# Altium integrated library EFR_Lib.IntLib: 430 symbols (part 3 of 6)
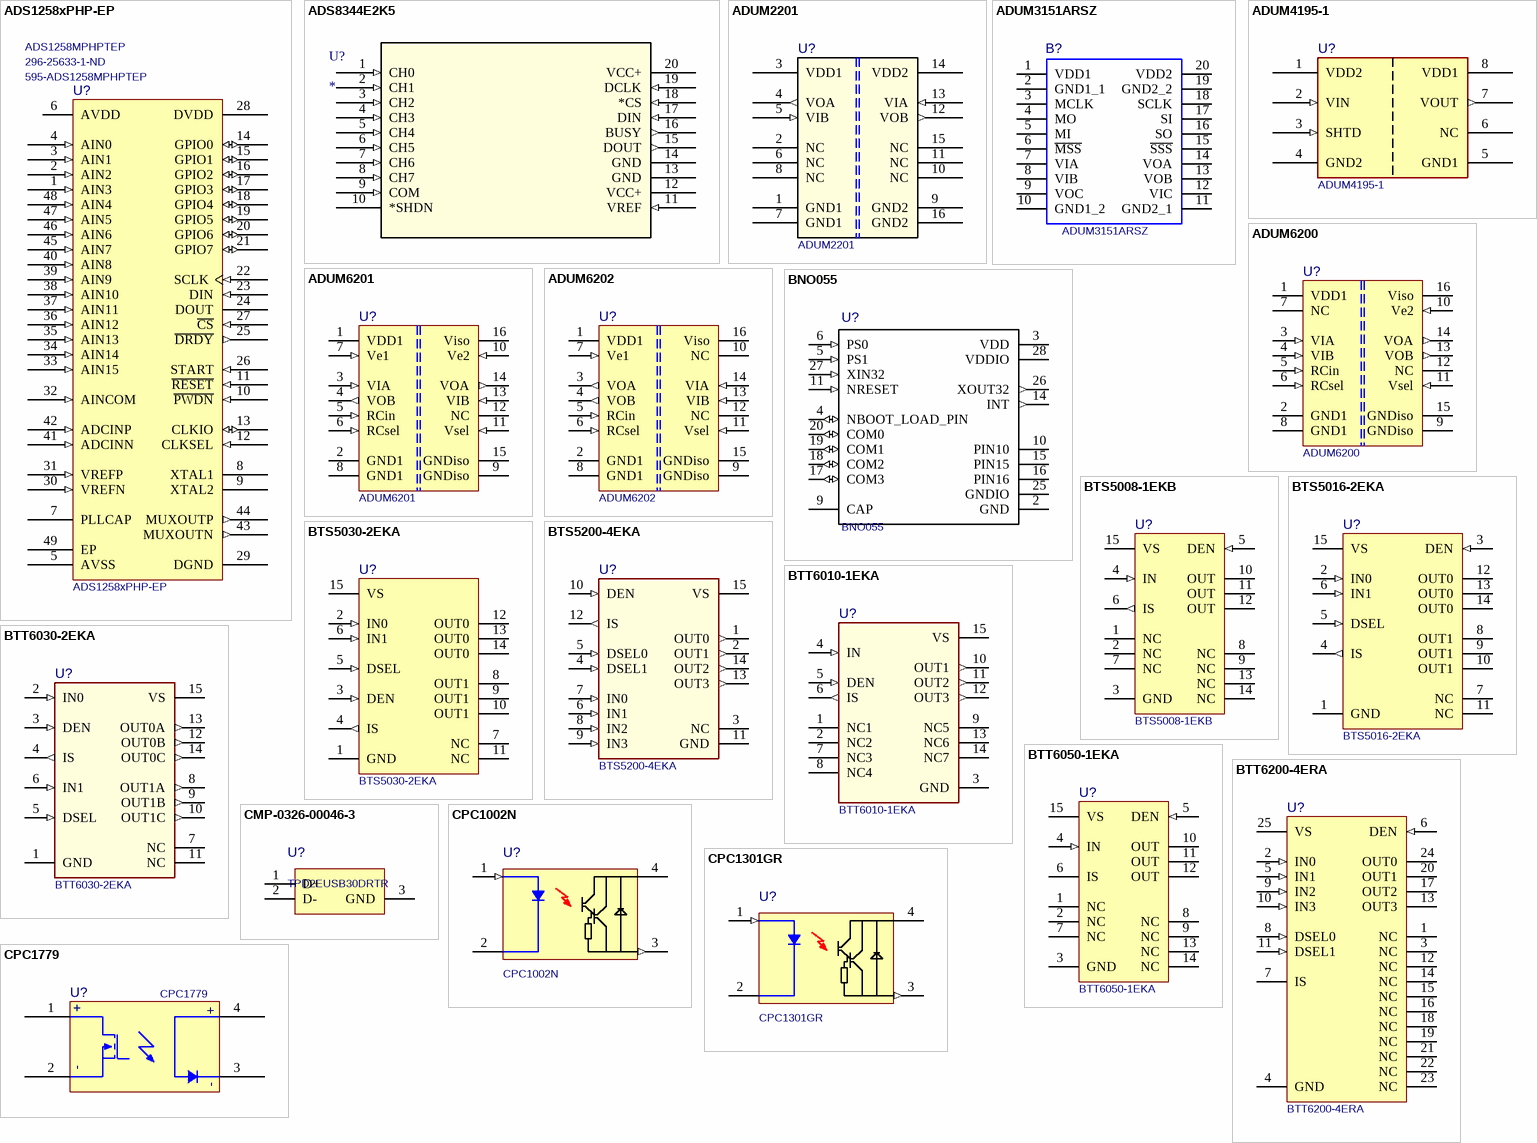
[diagram p31: symbols ADS1258xPHP-EP to CPC1779]

## ADUM6201
designator U?
Dual-Channel, 5 kV Isolators with Integrated DC-to-DC Converter; Manufacturer: Analog Devices; Pin Number: 16; ComponentLink1Description: Datasheet (Online); ComponentLink1URL: https://www.analog.com/media/en/technical-documentation/data-sheets/ADuM6200_6201_6202.pdf; ComponentLink2Description: Datasheet (Local); ComponentLink2URL: ..\Datasheet\Analog_Devices\ADuM6200_6201_6202.pdf; ComponentLink3Description: Datasheet (SVN); ComponentLink3URL: https://teamsvn.elbflorace.de/00_Bibliothek/Libraries/Altium/AltiumLibs/Datasheet/ADuM6200_6201_6202.pdf; ComponentLink4Description: Manufacturer-Site; ComponentLink4URL: https://www.analog.com/en/products/adum6201.html; Manufacturer P/N: ADuM6201; Mounting Technology: SMT
footprint SOIC_IC_16 (RI-16-1) (SOIC, 16-Leads, Body 12,80x7,50mm, Pitch 1,27mm, IPC Low Density)
footprint SOIC_W_16 (RW-16) (SOIC, 16-Leads, Body 10,5x7,6mm (max), Pitch 1,27mm, IPC Medium Density)
pins: 1 VDD1 "Primary Supply Voltage, 3.0 V to 5.5 V.", 2 GND1 "Ground Reference for the Primary Side of the Isolator. Pin 2 and Pin 8 are internally connected to each other, and it is recommended that both pins be connected to a common ground.", 3 VIA (in) "Logic Input A", 4 VOB (out) "Logic Output B", 5 RCin (in) "Regulation Control Input. This pin must be connected to the RCOUT pin of a master isoPower device or tied low. This pin must not be tied high if RCSEL is low; this combination causes excessive voltage on the secondary side of the isolator, damaging the ADuM6201 and possibly the devices that it powers.", 6 RCsel (in) "Control Input. Determines self-regulation mode (RCSEL high) or slave mode (RCSEL low), allowing external regulation. This pin is weakly pulled to the high state. In noisy environments, tie this pin either high or low.", 7 Ve1 (in) "Data Enable Input. When this pin is high or not connected, the primary output is active; when this pin is low, the output is in a high-Z state.", 8 GND1 "Ground Reference for the Primary Side of the Isolator. Pin 2 and Pin 8 are internally connected to each other, and it is recommended that both pins be connected to a common ground.", 9 GNDiso "Internally connected to Pin 15, connect to isolated ground", 10 Ve2 (in) "Data Enable Input. When this pin is high or not connected, the secondary output is active; when this pin is low, the output is in a high-Z state.", 11 Vsel (in) "Output Voltage Selection. When VSEL = VISO, the VISO setpoint is 5.0 V. When VSEL = GNDISO, the VISO setpoint is 3.3 V.  In slave regulation mode, this pin has no function.", 12 NC "No Internal Connection.", 13 VIB (in) "Logic Input B", 14 VOA (out) "Logic Output A", 15 GNDiso "Ground Reference for the Secondary Side of the Isolator. Pin 9 and Pin 15 are internally connected to each other, and it is recommended that both pins be connected to a common ground.", 16 Viso "Secondary Supply Voltage. Output for secondary side isolated data channels and external loads."

## ADUM6202
designator U?
Dual-Channel, 5 kV Isolators with Integrated DC-to-DC Converter; Manufacturer: Analog Devices; Pin Number: 16; ComponentLink1Description: Datasheet (Online); ComponentLink1URL: https://www.analog.com/media/en/technical-documentation/data-sheets/ADuM6200_6201_6202.pdf; ComponentLink2Description: Datasheet (Local); ComponentLink2URL: ..\Datasheet\Analog_Devices\ADuM6200_6201_6202.pdf; ComponentLink3Description: Datasheet (SVN); ComponentLink3URL: https://teamsvn.elbflorace.de/00_Bibliothek/Libraries/Altium/AltiumLibs/Datasheet/Analog_Devices/ADuM6200_6201_6202.pdf; ComponentLink4Description: Manufacturer-Site; ComponentLink4URL: https://www.analog.com/en/products/adum6202.html; Manufacturer P/N: ADuM6202; Mounting Technology: SMT
footprint SOIC_IC_16 (RI-16-1) (SOIC, 16-Leads, Body 12,80x7,50mm, Pitch 1,27mm, IPC Low Density)
footprint SOIC_W_16 (RW-16) (SOIC, 16-Leads, Body 10,5x7,6mm (max), Pitch 1,27mm, IPC Medium Density)
pins: 1 VDD1 "Primary Supply Voltage, 3.0 V to 5.5 V.", 2 GND1 "Ground Reference for the Primary Side of the Isolator. Pin 2 and Pin 8 are internally connected to each other, and it is recommended that both pins be connected to a common ground.", 3 VOA (out) "Logic Output A", 4 VOB (out) "Logic Output B", 5 RCin (in) "Regulation Control Input. This pin must be connected to the RCOUT pin of a master isoPower device or tied low. This pin must not be tied high if RCSEL is low; this combination causes excessive voltage on the secondary sideof the isolator, damaging the ADuM6202 and possibly the devices that it powers.", 6 RCsel (in) "Control Input. Determines self-regulation mode (RCSEL high) or slave mode (RCSEL low), allowing external regulation. This pin is weakly pulled to the high state. In noisy environments, tie this pin either high or low.", 7 Ve1 (in) "Data Enable Input. When this pin is high or not connected, the primary output is active; when this pin is low, the output is in a high-Z state.", 8 GND1 "Ground Reference for the Primary Side of the Isolator. Pin 2 and Pin 8 are internally connected to each other, and it is recommended that both pins be connected to a common ground.", 9 GNDiso "Internally connected to Pin 15, connect to isolated ground", 10 NC "No Internal Connection.", 11 Vsel (in) "Output Voltage Selection. When VSEL = VISO, the VISO setpoint is 5.0 V. When VSEL = GNDISO, the VISO setpoint is 3.3 V.  In slave regulation mode, this pin has no function.", 12 NC "No Internal Connection.", 13 VIB (in) "Logic Input B", 14 VIA (in) "Logic Input A", 15 GNDiso "Ground Reference for the Secondary Side of the Isolator. Pin 9 and Pin 15 are internally connected to each other, and it is recommended that both pins be connected to a common ground.", 16 Viso "Secondary Supply Voltage. Output for secondary side isolated data channels and external loads."

## BNO055
designator U?
Accelerometer, Gyroscope, Magnetometer, 9 Axis Sensor IÂ²C, UART Output; Manufacturer: Bosch; Manufacturer P/N: BNO055; Package: LGA-28 Bosch; ComponentLink1Description: Hersteller; ComponentLink1URL: https://www.mouser.de/ProductDetail/Bosch-Sensortec/BNO055?qs=QhAb4EtQfbV8Z2YmISucWw==; ComponentLink2Description: Datenblatt; ComponentLink2URL: https://www.mouser.de/datasheet/2/783/BST-BNO055-DS000-1509603.pdf; ComponentLink3Description: SnapEDA; ComponentLink3URL: https://www.snapeda.com/parts/BNO055/Bosch%20Sensortec/view-part/51961/?ref=snap; Mounting Technology: SMT
footprint LGA28R50P4X10_380X520X100
pins: 2 GND (power), 3 VDD (power), 4 NBOOT_LOAD_PIN (io), 5 PS1 (in), 6 PS0 (in), 9 CAP, 10 PIN10 (power), 11 NRESET (in), 14 INT (out), 15 PIN15 (power), 16 PIN16 (power), 17 COM3 (io), 18 COM2 (io), 19 COM1 (io), 20 COM0 (io), 25 GNDIO (power), 26 XOUT32 (out), 27 XIN32 (in), 28 VDDIO (power)

## BTS5008-1EKB
designator U?
Smart Highside Power Switch Single Channnel, 8 mOhm, -40 to 150 degC, PG-DSO-14-47, Reel, Green; Manufacturer: Infineon; Green: TRUE; Packing: Reel; PackageDescription: 14-Pin Plastic (Green) Dual Small Outline Package, 8.65 x 3.9 mm Body, 1.27 mm Pitch; PackageReference: PG-DSO-14-47 EP; DatasheetVersion: Rev. 2.0; ComponentLink2Description: Datasheet; ComponentLink1URL: http://www.infineon.com/; Code_JEDEC: MS-012; Mounting Technology: SMT; RevisionNote: Lost Devices pt2; ComponentLink3URL: http://www.infineon.com/dgdl/BTS5008-1EKB-Data-Sheet-20-Infineon.pdf?folderId=db3a304314dca3890114df197b25000f&fileId=db3a30433daca496013db00d97ac1594&sId=db3a30433f2e70c5013f420039644e8f; ComponentLink1Description: Manufacturer URL; ComponentLink3Description: Package Specification; Manufacturer P/N: BTS5008-1EKB; Halogen-free: TRUE; ComponentLink2URL: http://www.infineon.com/dgdl/BTS5008-1EKB-Data-Sheet-20-Infineon.pdf?folderId=db3a304314dca3890114df197b25000f&fileId=db3a30433daca496013db00d97ac1594; PackageVersion: Apr-12
footprint INF-PG-DSO-14-47 EP_M (SOP, 14-Leads, Body 8.65x3.9mm, Pitch 1.27mm, Thermal Pad 6.5x2.75mm, IPC Low Density)
footprint INF-PG-DSO-14-47 EP_N (SOP, 14-Leads, Body 8.65x3.9mm, Pitch 1.27mm, Thermal Pad 6.5x2.75mm, IPC Medium Density)
footprint INF-PG-DSO-14-47 EP_L (SOP, 14-Leads, Body 8.65x3.9mm, Pitch 1.27mm, Thermal Pad 6.5x2.75mm, IPC High Density)
pins: 1 NC "Not Connected; No internal connection to the chip", 2 NC "Not Connected; No internal connection to the chip", 3 GND (power) "GrouND; Ground connection", 4 IN (in) "INput channel; Input signal for channel activation", 5 DEN (in) "Diagnostic ENable; Digital signal to enable/disable the diagnosis of the device", 6 IS (out) "Sense; Sense current of the selected channel", 7 NC "Not Connected; No internal connection to the chip", 8 NC "Not Connected; No internal connection to the chip", 9 NC "Not Connected; No internal connection to the chip", 10 OUT (power) "OUTput; Protected high side power output channel", 11 OUT (power) "OUTput; Protected high side power output channel", 12 OUT (power) "OUTput; Protected high side power output channel", 13 NC "Not Connected; No internal connection to the chip", 14 NC "Not Connected; No internal connection to the chip", 15 VS (power) "Voltage Supply; Battery voltage"

## BTS5016-2EKA
designator U?
Smart High-Side Power Switch, 5 V to 28 V, -40 to 150 degC, PG-DSO-14, Reel, Green; Manufacturer: Infineon; Load Current (typ): 8 A; ton (max): 200 us; Recommended Operating Voltage Min.: 5 V; Diagnostic: Sense; Ptot (max): 2 W; RON (max) @ Tj: 150degreesC=32 mOhm; RON @ Tj: 25degreesC=16 mOhm; Channels: 2; Green: TRUE; Recommended Operating Voltage Max.: 28 V; ComponentLink1URL: http://www.infineon.com/; ComponentLink2URL: https://www.infineon.com/dgdl/Infineon-BTS5016-2EKA-DS-v01_00-EN.pdf?fileId=5546d4625a888733015aa41a5e161129; ComponentLink3URL: http://www.infineon.com/dgdl/BTS5030-2EKA_Data-Sheet_21.pdf?folderId=db3a30431400ef68011421b54e2e0564&fileId=db3a30432a14dd54012a3c882d7f5994&sId=db3a30433d68e984013d83e34cd77b82; DatasheetVersion: Rev. 1.0; Halogen-free: TRUE; Mounting Technology: SMT; Manufacturer P/N: BTS5016-2EKA; Packing: Reel; Code_JEDEC: MS-012; PackageVersion: Sep-11; PackageReference: PG-DSO-14-40; Mounting: SMT; ComponentLink3Description: Package Specification; toff (max): 200 us; PackageDescription: 14-Pin Plastic (Green) Dual Small Outline Package, 8.65 x 3.9 mm Body, 1.27 mm Pitch; ComponentLink2Description: Datasheet; ComponentLink1Description: Manufacturer URL
footprint INF-PG-DSO-14-40_L (SOP, 14-Leads, Body 8.65x3.9mm, Pitch 1.27mm, Thermal Pad 6.5x2.75mm, IPC High Density)
footprint INF-PG-DSO-14-40_M (SOP, 14-Leads, Body 8.65x3.9mm, Pitch 1.27mm, Thermal Pad 6.5x2.6mm, IPC Low Density)
footprint INF-PG-DSO-14-40_N (SOP, 14-Leads, Body 8.65x3.9mm, Pitch 1.27mm, Thermal Pad 6.5x2.75mm, IPC Medium Density)
pins: 1 GND (power) "GrouND; Ground connection", 2 IN0 (in) "INput channel 0; Input signal for channel 0 activation", 3 DEN (in) "Diagnostic ENable; Digital signal to enable/disable the diagnosis of the device", 4 IS (out) "Sense; Sense current of the selected channel", 5 DSEL (in) "Diagnostic SELection; Digital signal to select the channel to be diagnosed", 6 IN1 (in) "INput channel 1; Input signal for channel 1 activation", 7 NC "Not Connected; No internal connection to the chip", 8 OUT1 (power) "OUTput 1; Protected high side power output channel 1", 9 OUT1 (power) "OUTput 1; Protected high side power output channel 1", 10 OUT1 (power) "OUTput 1; Protected high side power output channel 1", 11 NC "Not Connected; No internal connection to the chip", 12 OUT0 (power) "OUTput 0; Protected high side power output channel 0", 13 OUT0 (power) "OUTput 0; Protected high side power output channel 0", 14 OUT0 (power) "OUTput 0; Protected high side power output channel 0", 15 VS (power) "Voltage Supply; Battery voltage"

## BTS5030-2EKA
designator U?
Smart High-Side Power Switch, 5 V to 28 V, -40 to 150 degC, PG-DSO-14, Reel, Green; Manufacturer: Infineon; Load Current (typ): 4 A; ton (max): 200 us; Recommended Operating Voltage Min.: 5 V; Diagnostic: Sense; Ptot (max): 2 W; RON (max) @ Tj: 150degreesC=32 mOhm; RON @ Tj: 25degreesC=16 mOhm; Channels: 2; Green: TRUE; Recommended Operating Voltage Max.: 28 V; ComponentLink1URL: http://www.infineon.com/; ComponentLink2URL: https://www.infineon.com/dgdl/Infineon-BTS5030-2EKA-DS-v02_01-EN.pdf?fileId=5546d4625a888733015aa41a4f9f1125; ComponentLink3URL: http://www.infineon.com/dgdl/BTS5030-2EKA_Data-Sheet_21.pdf?folderId=db3a30431400ef68011421b54e2e0564&fileId=db3a30432a14dd54012a3c882d7f5994&sId=db3a30433d68e984013d83e34cd77b82; DatasheetVersion: Rev. 1.0; Halogen-free: TRUE; Mounting Technology: SMT; Manufacturer P/N: BTS5030-2EKA; Packing: Reel; Code_JEDEC: MS-012; PackageVersion: Sep-11; PackageReference: PG-DSO-14-40; Mounting: SMT; ComponentLink3Description: Package Specification; toff (max): 200 us; PackageDescription: 14-Pin Plastic (Green) Dual Small Outline Package, 8.65 x 3.9 mm Body, 1.27 mm Pitch; ComponentLink2Description: Datasheet; ComponentLink1Description: Manufacturer URL
footprint INF-PG-DSO-14-40_L (SOP, 14-Leads, Body 8.65x3.9mm, Pitch 1.27mm, Thermal Pad 6.5x2.75mm, IPC High Density)
footprint INF-PG-DSO-14-40_M (SOP, 14-Leads, Body 8.65x3.9mm, Pitch 1.27mm, Thermal Pad 6.5x2.6mm, IPC Low Density)
footprint INF-PG-DSO-14-40_N (SOP, 14-Leads, Body 8.65x3.9mm, Pitch 1.27mm, Thermal Pad 6.5x2.75mm, IPC Medium Density)
pins: 1 GND (power) "GrouND; Ground connection", 2 IN0 (in) "INput channel 0; Input signal for channel 0 activation", 3 DEN (in) "Diagnostic ENable; Digital signal to enable/disable the diagnosis of the device", 4 IS (out) "Sense; Sense current of the selected channel", 5 DSEL (in) "Diagnostic SELection; Digital signal to select the channel to be diagnosed", 6 IN1 (in) "INput channel 1; Input signal for channel 1 activation", 7 NC "Not Connected; No internal connection to the chip", 8 OUT1 (power) "OUTput 1; Protected high side power output channel 1", 9 OUT1 (power) "OUTput 1; Protected high side power output channel 1", 10 OUT1 (power) "OUTput 1; Protected high side power output channel 1", 11 NC "Not Connected; No internal connection to the chip", 12 OUT0 (power) "OUTput 0; Protected high side power output channel 0", 13 OUT0 (power) "OUTput 0; Protected high side power output channel 0", 14 OUT0 (power) "OUTput 0; Protected high side power output channel 0", 15 VS (power) "Voltage Supply; Battery voltage"

## BTS5200-4EKA
designator U?
Smart High-Side Power Switch, Quad Channel, 32 mOhm; Manufacturer: Infineon Technologies; Manufacturer P/N: BTS5200-4EKA; PackageReference: PG-DSO-14-48-EP; ComponentLink1Description: Datasheet; ComponentLink1URL: https://www.infineon.com/dgdl/Infineon-BTS5200-4EKA-DS-v01_00-EN.pdf?fileId=5546d4625a888733015aa3fee7cd1052; ComponentLink2Description: Manufacturer; ComponentLink2URL: https://www.infineon.com/cms/en/product/power/smart-low-side-high-side-switches/automotive-smart-high-side-switch-profet/profet-12v/bts5200-4eka/#!packaging; Mounting Technology: SMT
footprint INF-PG-DSO-14-48 (Footprint not found)
pins: 1 OUT0 (out) "OUTput 0; Protected high side power output channel 0.", 2 OUT1 (out) "Output 1; Protected high side power output channel 1.", 3 NC "Not Connected; No internal connection to the chip.", 4 DSEL1 (in) "Diagnostic Selection; Digital signal to select the channel to be diagnosed.", 5 DSEL0 (in) "Diagnostic Selection; Digital signal to select the channel to be diagnosed.", 6 IN1 (in) "Input channel 1; Input signal for channel 1 activation.", 7 IN0 (in) "Input channel 0; Input signal for channel 0 activation.", 8 IN2 (in) "Input channel 2; Input signal for channel 2 activation.", 9 IN3 (in) "Input channel 3; Input signal for channel 3 activation.", 10 DEN (in) "Diagnostic Enable; Digital signal to enable/disable the diagnosis of the device.", 11 GND (power) "Ground", 12 IS (out) "Sense; Sense current of the selected channel.", 13 OUT3 (out) "Output 3; Protected high side power output channel 3.", 14 OUT2 (out) "Output 2; Protected high side power output channel 2.", 15 VS (power) "Voltage Supply; Battery voltage"

## BTT6010-1EKA
designator U?
Smart High-Side Power Switch, Single Channel, 10 mOhm, PROFET +24V; Manufacturer: Infineon Technologies; ComponentLink1Description: Datasheet; ComponentLink1URL: https://www.infineon.com/dgdl/Infineon-BTT6010-1EKA-DataSheet-v01_01-EN.pdf?fileId=5546d4626da6c043016dc935cfed39a3; ComponentLink2Description: Manufacturer; ComponentLink2URL: https://www.infineon.com/cms/en/product/power/smart-low-side-high-side-switches/automotive-smart-high-side-switch-profet/profet-24v/btt6010-1eka/; Type: High-Side-Mosfet; Manufacturer P/N: BTT6010-1EKA; Package: PG-DSO-14-47 EP; Mounting Technology: SMT
footprint INF-PG-DSO-14-47 EP_L (SOP, 14-Leads, Body 8.65x3.9mm, Pitch 1.27mm, Thermal Pad 6.5x2.75mm, IPC High Density)
footprint INF-PG-DSO-14-47 EP_N (SOP, 14-Leads, Body 8.65x3.9mm, Pitch 1.27mm, Thermal Pad 6.5x2.75mm, IPC Medium Density)
footprint INF-PG-DSO-14-47 EP_M (SOP, 14-Leads, Body 8.65x3.9mm, Pitch 1.27mm, Thermal Pad 6.5x2.75mm, IPC Low Density)
pins: 1 NC1 "Not Connected", 2 NC2 "Not Connected", 3 GND (power) "Ground", 4 IN (in) "Input channel", 5 DEN (in) "Diagnostic Enable", 6 IS (out) "Sense", 7 NC3 "Not Connected", 8 NC4 "Not Connected", 9 NC5 "Not Connected", 10 OUT1 (out) "Output", 11 OUT2 (out) "Output", 12 OUT3 (out) "Output", 13 NC6 "Not Connected", 14 NC7 "Not Connected", 15 VS (power) "Voltage Supply"

## BTT6030-2EKA
designator U?
Smart High-Side Power Switch, Dual Channel, 32 mOhm; Manufacturer: Infineon Technologies; Manufacturer P/N: BTT6030-2EKA; PackageReference: PG-DSO-14-40 EP; ComponentLink1Description: Datasheet; ComponentLink1URL: https://www.infineon.com/dgdl/Infineon-BTT6030-2EKA-DataSheet-v01_01-EN.pdf?fileId=5546d4626da6c043016dc9516a1f39b6; ComponentLink2Description: Manufacturer; ComponentLink2URL: https://www.infineon.com/cms/en/product/power/smart-low-side-high-side-switches/automotive-smart-high-side-switch-profet/profet-24v/btt6030-2eka/; Mounting Technology: SMT
footprint INF-PG-DSO-14-40_L (SOP, 14-Leads, Body 8.65x3.9mm, Pitch 1.27mm, Thermal Pad 6.5x2.75mm, IPC High Density)
footprint INF-PG-DSO-14-40_N (SOP, 14-Leads, Body 8.65x3.9mm, Pitch 1.27mm, Thermal Pad 6.5x2.75mm, IPC Medium Density)
footprint INF-PG-DSO-14-40_M (SOP, 14-Leads, Body 8.65x3.9mm, Pitch 1.27mm, Thermal Pad 6.5x2.6mm, IPC Low Density)
pins: 1 GND (power) "Ground", 2 IN0 (in) "Input channel 0; Input signal for channel 0 activation.", 3 DEN (in) "Diagnostic Enable; Digital signal to enable/disable the diagnosis of the device.", 4 IS (out) "Sense; Sense current of the selected channel.", 5 DSEL (in) "Diagnostic Selection; Digital signal to select the channel to be diagnosed.", 6 IN1 (in) "Input channel 1; Input signal for channel 1 activation.", 7 NC "Not Connected; No internal connection to the chip.", 8 OUT1A (out) "Output 1; Protected high side power output channel 1.", 9 OUT1B (out) "Output 1; Protected high side power output channel 1.", 10 OUT1C (out) "Output 1; Protected high side power output channel 1.", 11 NC "Not Connected; No internal connection to the chip.", 12 OUT0B (out) "OUTput 0; Protected high side power output channel 0.", 13 OUT0A (out) "OUTput 0; Protected high side power output channel 0.", 14 OUT0C (out) "OUTput 0; Protected high side power output channel 0.", 15 VS (power) "Voltage Supply; Battery voltage"

## BTT6050-1EKA
designator U?
Smart High-Side Power Switch, 5 to 36 V, -40 to 150 degC, PG-DSO-14, Reel, Green; Manufacturer: Infineon; toff (max): 150 us; Ptot (max): 1.6 W; IL (nom)min - all channels active: 4.5 A; Channels: 1; IL(SC): 38 A; Recommended Operating Voltage Max.: 36 V; Green: TRUE; Diagnostic: Sense; Recommended Operating Voltage Min.: 5 V; ComponentLink2URL: https://datasheet.ciiva.com/29899/infineon-btt6050-1eka-ds-v01-00-en-29899189.pdf?src-supplier=Avnet; ton (max): 150 us; PackageDescription: 14-Pin Plastic (Green) Dual Small Outline Package, 8.65 x 3.9 mm Body, 1.27 mm Pitch; PackageVersion: Apr-12; Halogen-free: TRUE; Manufacturer P/N: BTT6050-1EKA; ComponentLink3URL: http://www.infineon.com/cms/packages/SMD_-_Surface_Mounted_Devices/P-PG-DSO/P-PG-DSO-14-33x_-40x_-43.html?__locale=en; PackageReference: PG-DSO-14-47 EP; Mounting: SMD; DatasheetVersion: Rev. 1.0; Load Current (typ): 4.5 A; IL (nom)min - one channel active: 4.5 A; ComponentLink1URL: https://www.mouser.de/Search/Refine?N=4294759026&Keyword=726-BTT6050-1EKA&utm_source=octopart&utm_medium=aggregator&utm_campaign=726-BTT6050-1EKA&utm_content=Infineon; ComponentLink1Description: Manufacturer URL; ComponentLink2Description: Datasheet; IL (SCp): 38 A; Code_JEDEC: MS-012; Mounting Technology: SMT; Packing: Reel; ComponentLink3Description: Package Specification
footprint INF-PG-DSO-14-47 EP_M (SOP, 14-Leads, Body 8.65x3.9mm, Pitch 1.27mm, Thermal Pad 6.5x2.75mm, IPC Low Density)
pins: 1 NC "Not Connected; No internal connection to the chip", 2 NC "Not Connected; No internal connection to the chip", 3 GND (power) "GrouND; Ground connection", 4 IN (in) "INput channel; Input signal for channel activation", 5 DEN (in) "Diagnostic ENable; Digital signal to enable/disable the diagnosis of the device", 6 IS (hiz) "Sense; Sense current of the selected channel", 7 NC "Not Connected; No internal connection to the chip", 8 NC "Not Connected; No internal connection to the chip", 9 NC "Not Connected; No internal connection to the chip", 10 OUT (power) "OUTput; Protected high side power output channel", 11 OUT (power) "OUTput; Protected high side power output channel", 12 OUT (power) "OUTput; Protected high side power output channel", 13 NC "Not Connected; No internal connection to the chip", 14 NC "Not Connected; No internal connection to the chip", 15 VS (power) "Voltage Supply; Battery voltage"

## BTT6200-4ERA
designator U?
4ch Switch with Sense Function, 1 A; Manufacturer P/N: BTT6200-4EMA; Manufacturer: Infineon; Voltage_range: 5 V ... 36 V; Nominal load current (all channels active): 1 A; Nominal load current (one channel active): 1.5 A; Typical current sense ratio: 300; Maximum ON state resistance at   T  J   = 150 °C per channel: 400 m  Ω; ComponentLink1Description: Datasheet; ComponentLink1URL: https://www.infineon.com/dgdl/Infineon-BTT6200-4EMA-DataSheet-v01_00-EN.pdf?fileId=5546d4626da6c043016dc935c44a399f; ComponentLink2Description: Manufacturer; ComponentLink2URL: https://www.infineon.com/cms/en/product/power/smart-low-side-high-side-switches/automotive-smart-high-side-switch-profet/profet-24v/btt6200-4ema/; Mounting Technology: SMT
footprint PG-SSOP-24-14 (SOP, 24-Leads, Body 8,65x3,90mm, Pitch 0,65mm, Thermal Pad 6,65x2,90mm, IPC Medium Density)
pins: 1 NC "Not Connected; No internal connection to the chip", 2 IN0 (in) "INput channel 0; Input signal for channel 0 activation", 3 NC "Not Connected; No internal connection to the chip", 4 GND (power), 5 IN1 (in) "INput channel 1; Input signal for channel 1 activation", 6 DEN (in) "Diagnostic ENable; Digital signal to enable/disable the diagnosis of the device", 7 IS (hiz) "Sense; Sense current of the selected channel", 8 DSEL0 (in) "Diagnostic SELection; Digital signal to select the channel to be diagnosed", 9 IN2 (in) "INput channel 2; Input signal for channel 2 activation", 10 IN3 (in) "INput channel 3; Input signal for channel 3 activation", 11 DSEL1 (in) "Diagnostic SELection; Digital signal to select the channel to be diagnosed", 12 NC "Not Connected; No internal connection to the chip", 13 OUT3 (power) "OUTput 3; Protected high side power output channel 3", 14 NC "Not Connected; No internal connection to the chip", 15 NC "Not Connected; No internal connection to the chip", 16 NC "Not Connected; No internal connection to the chip", 17 OUT2 (power) "OUTput 2; Protected high side power output channel 2", 18 NC "Not Connected; No internal connection to the chip", 19 NC "Not Connected; No internal connection to the chip", 20 OUT1 (power) "OUTput 1; Protected high side power output channel 1", 21 NC "Not Connected; No internal connection to the chip", 22 NC "Not Connected; No internal connection to the chip", 23 NC "Not Connected; No internal connection to the chip", 24 OUT0 (power) "OUTput 0; Protected high side power output channel 0", 25 VS (power) "Voltage Supply; Battery voltage"

## CMP-0326-00046-3
designator U?, comment TPD2EUSB30DRTR
ESD Solution for Super-Speed (6 Gbps) USB 3.0 Interface, 2 Channels, -40 to +85 degC, 3-pin SOT (DRT), Green (Rohs & No Sb/Br); Manufacturer: Texas Instruments; Differential Capacitance(pF): 0.01; Breakdown Voltage(Min)(V): 9; HDMI: TRUE; IEC 61000-4-2 Air-Gap(+/- kV): 8; IO Leakage Current(nA): 10; IO Capacitance(Typ)(pF): 0.7; Mounting Technology: SMT; PackageDescription: 3-Flat Lead Plastic Small Outline, 1 x 1 mm (inc leads), 0.35 mm Pitch; IEC 61000-4-2 Contact(+/- kV): 8; USB Super Speed: TRUE; Eco-Plan: Green (RoHS & no Sb/Br); USB High Speed: TRUE; PackageReference: DRT0003A; SubFamily: ESD Solution; USB Full Speed: TRUE; ComponentLink1Description: Datasheet; ComponentLink2URL: SamplesURL:http://www.ti.com/product/tpd2eusb30#samples; PackageVersion: revD, Jun-2008; ComponentLink2Description: URL Link1; 1394 / Firewire: TRUE; Manufacturer P/N: TPD2EUSB30DRTR; ComponentLink1URL: http://www.ti.com/general/docs/lit/getliterature.tsp?genericPartNumber=TPD2EUSB30&fileType=pdf; DatasheetVersion: SLVSAC2C; Serial ATA / eSATA: TRUE
footprint DRT0003A (SOTFL, 3-Leads, Body 1x1mm (inc leads), Pitch 0.35mm)
pins: 1 D+ "High-speed ESD clamp, provides ESD protection to the high-speed differential data line.", 2 D- "High-speed ESD clamp, provides ESD protection to the high-speed differential data line.", 3 GND (power) "Ground"

## CPC1002N
designator U?
2mA Diodenstrom, 60V Breakdown, 700 mA; Manufacturer: IXYS SEMICONDUCTOR; Height (mm): 2.055; Manufacturer P/N: CPC1002N; ComponentLink1Description: Mouser-Link; ComponentLink1URL: https://www.mouser.de/ProductDetail/IXYS-Integrated-Circuits/CPC1002N?qs=h2iAtNzNjMSWxW51nm%252BAcA%3D%3D; ComponentLink2Description: Datasheet; ComponentLink2URL: https://www.mouser.de/datasheet/2/240/CPC1002N-1546124.pdf; Mounting Technology: SMT
footprint SOP254P610X206-4N
pins: 1 IN+ (in), 2 IN-, 3 OUT2 (out), 4 OUT1 (power)

## CPC1301GR
designator U?
1mA Diodenstrom, 350V Breakdown; Manufacturer: IXYS SEMICONDUCTOR; Manufacturer P/N: CPC1301GR; ComponentLink1Description: Datenblatt von IXYS-Website; ComponentLink1URL: http://www.ixysic.com/home/pdfs.nsf/www/CPC1301.pdf/$file/CPC1301.pdf; ComponentLink2Description: digi-key Produkt; ComponentLink2URL: https://www.mouser.de/datasheet/2/240/CPC1002N-1546124.pdf; Mounting Technology: SMT
footprint SOP254P952X335-4N
pins: 1 IN+ (in), 2 IN-, 3 OUT2 (out), 4 OUT1 (power)

## CPC1779
designator U?
Single-Pole, Normally Open  ISOPLUS-264 DC Power Relay; Manufacturer: IXYS; Manufacturer P/N: CPC1779J; Pin Number: 4; ComponentLink1Description: Datasheet; ComponentLink1URL: http://ixapps.ixys.com/DataSheet/CPC1779.pdf; Mounting Technology: THT; Supplier 1: Mouser; Supplier Part Number 1: 849-CPC1779J
footprint ISOPLUS-264 (ISOPLUS-264, 4-Pin, THT)
footprint ISOPLUS-264 with Heatsink (ISOPLUS-264, 4-Pin, THT)
pins: 1, 2, 3, 4
text: +; -

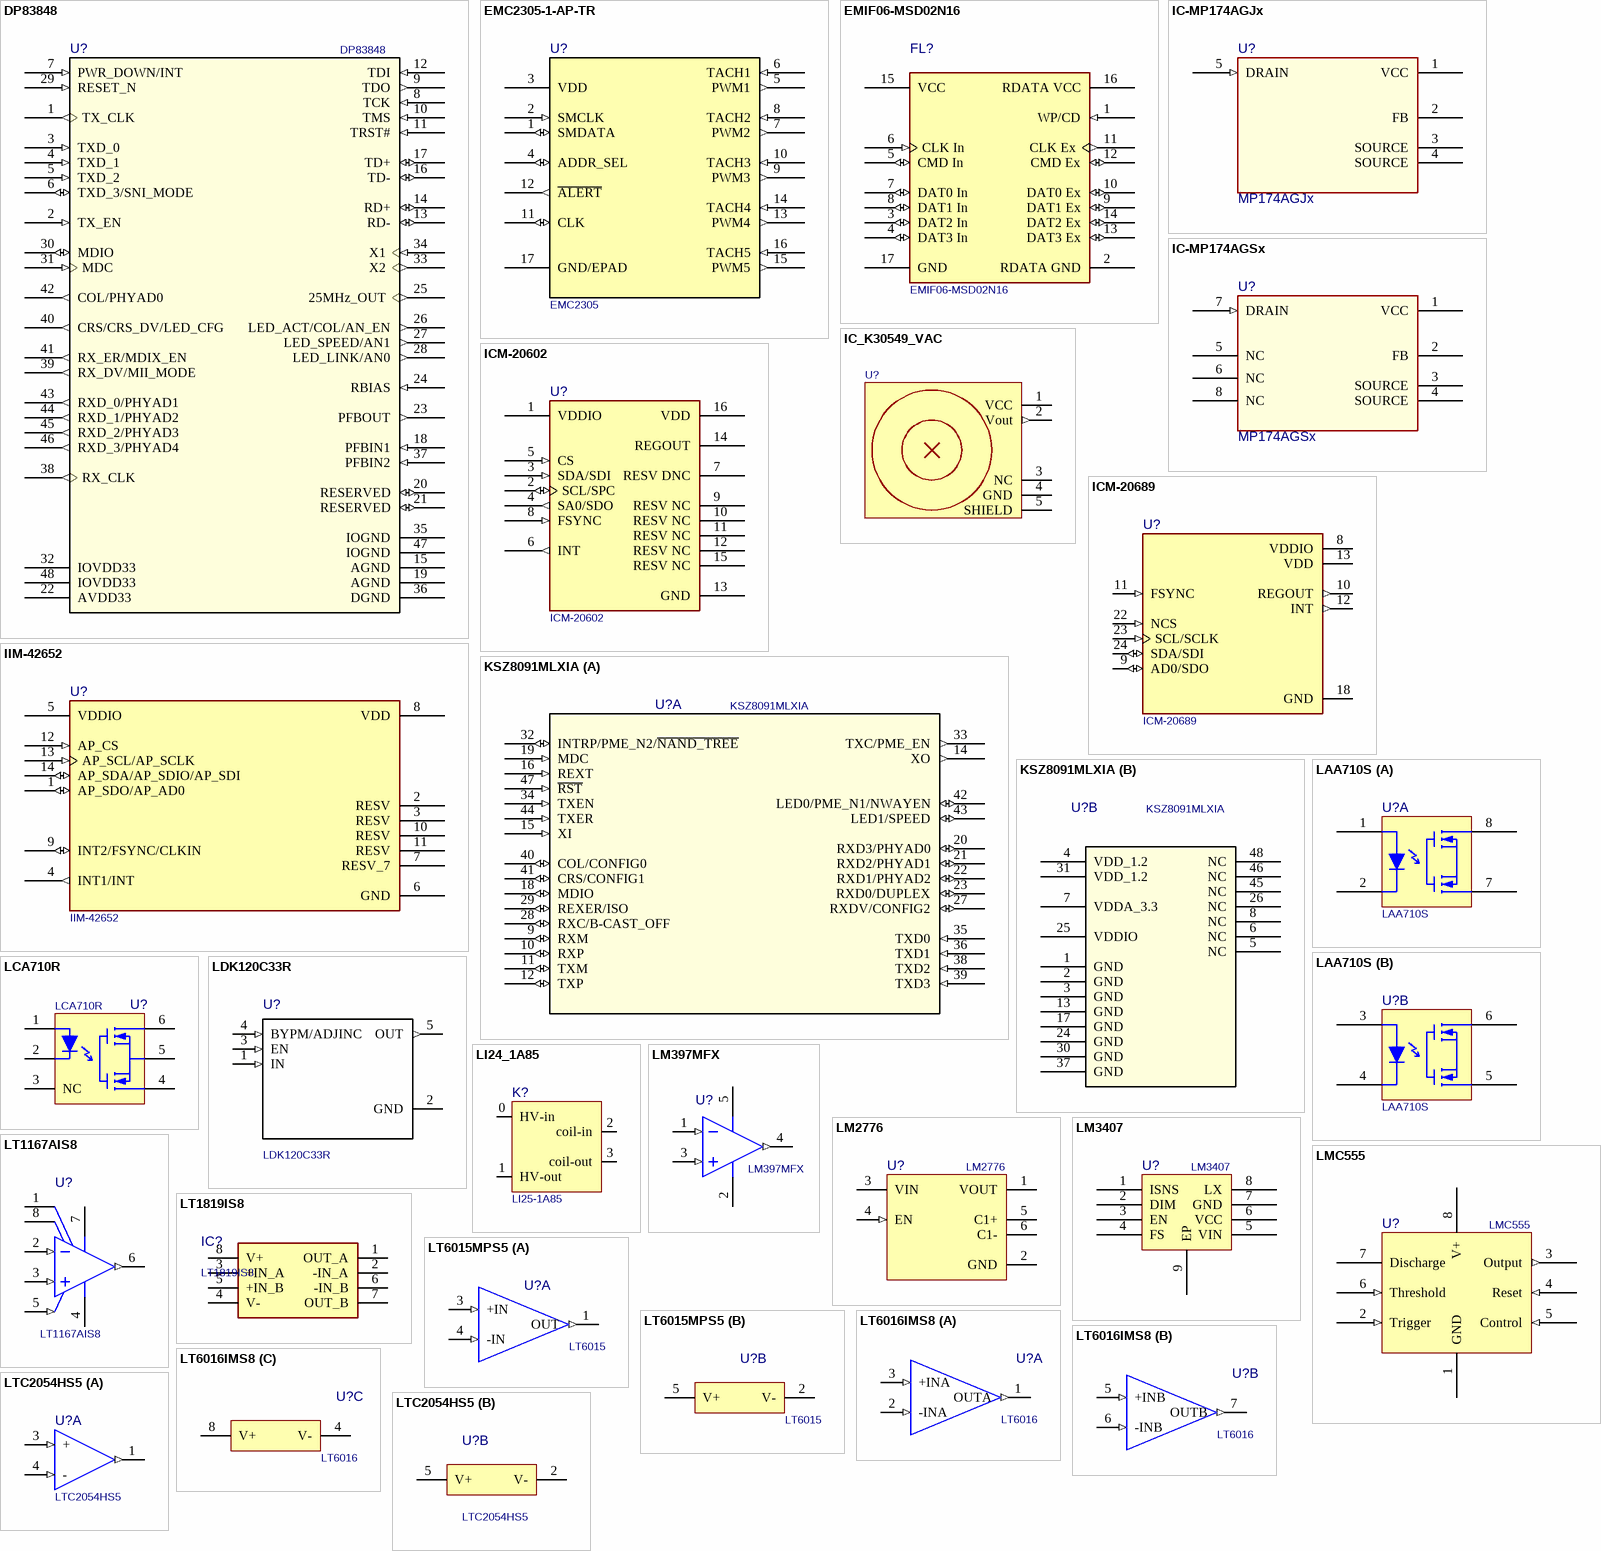
[diagram p12: symbols DP83848 to LTC2054HS5]

## DP83848
designator U?
10/100-Mbps Ethernet PHY transceiver with SNI & JTAG support; Manufacturer P/N: DP83848IVV; Manufacturer: NationalSemiconductor; PackageTopMarking: NSUZXYTTDP83848VVVBI; Pin Number: 48; PowerWise: N; CompType: InterfaceIC; ComponentLink1DescBC: DP83848IDatasheet; ComponentLink2DescA4: DP83848IWebPage; ComponentLink3DescAC: VBH48APackagePage; PackageVersion: revEMay-2007; PackageReference: VBH48A; Publisher: AltiumLimited; PackageDescription: LQFP7x7x14mm48Lead05mmPitch; SUPPLIER_3: 1Farnell; SUPPLIER_2: PartNumb0C1286817; SUPPLIER_4: 2Farnell; Supplier: PartNumb0F1528380; RoHS: Y; ComponentLink1URL: https://www.ti.com/product/DP83848I; ComponentLink2URL: https://www.ti.com/lit/gpn/dp83848i; ComponentLink3URL: http//wwwnationalcom/packaging/folders/vbh48ahtml; ComponentLink1Description: Manufacturer; ComponentLink1URL: *; ComponentLink2Description: Datasheet; ComponentLink2URL: *; Mounting Technology: SMT
footprint LQFP48_L (PT48A) (QFP, 48-Leads, Body 7x7mm, Pitch 0.5mm, IPC High Density)
footprint LQFP48_N (PT48A) (QFP, 48-Leads, Body 7x7mm, Pitch 0.5mm, IPC Medium Density)
footprint LQFP48_M (PT48A) (QFP, 48-Leads, Body 7x7mm, Pitch 0.5mm, IPC Low Density)
pins: 1 TX_CLK (out), 2 TX_EN (in), 3 TXD_0 (in), 4 TXD_1 (in), 5 TXD_2 (in), 6 TXD_3/SNI_MODE (io), 7 PWR_DOWN/INT (in), 8 TCK (in), 9 TDO (out), 10 TMS (in), 11 TRST# (in), 12 TDI (in), 13 RD- (io), 14 RD+ (io), 15 AGND (power), 16 TD- (io), 17 TD+ (io), 18 PFBIN1 (in), 19 AGND (power), 20 RESERVED (io), 21 RESERVED (io), 22 AVDD33 (power), 23 PFBOUT (out), 24 RBIAS (in), 25 25MHz_OUT (out), 26 LED_ACT/COL/AN_EN (out), 27 LED_SPEED/AN1 (out), 28 LED_LINK/AN0 (out), 29 RESET_N (in), 30 MDIO (io), 31 MDC (in), 32 IOVDD33 (power), 33 X2 (out), 34 X1 (in), 35 IOGND (power), 36 DGND (power), 37 PFBIN2 (in), 38 RX_CLK (out), 39 RX_DV/MII_MODE (out), 40 CRS/CRS_DV/LED_CFG (out), 41 RX_ER/MDIX_EN (out), 42 COL/PHYAD0 (out), 43 RXD_0/PHYAD1 (out), 44 RXD_1/PHYAD2 (out), 45 RXD_2/PHYAD3 (out), 46 RXD_3/PHYAD4 (out), 47 IOGND (power), 48 IOVDD33 (power)

## EMC2305-1-AP-TR
designator U?, comment EMC2305
5-Channel RPM-Based PWM Fan Controller; Manufacturer: Microchip; Manufacturer P/N: EMC2305-1-AP-TR; ComponentLink1Description: Datasheet; ComponentLink1URL: https://ww1.microchip.com/downloads/en/DeviceDoc/EMC2301-2-3-5-Data-Sheet-DS20006532A.pdf; ComponentLink2Description: Manufacturer; ComponentLink2URL: https://www.microchip.com/product/EMC2305; Mounting Technology: SMT
footprint QFN16_N (Microchip)
footprint QFN16_M (Microchip)
footprint QFN16_L (Microchip)
pins: 1 SMDATA (io), 2 SMCLK (in), 3 VDD (power), 4 ADDR_SEL (io), 5 PWM1 (out), 6 TACH1 (in), 7 PWM2 (out), 8 TACH2 (in), 9 PWM3 (out), 10 TACH3 (in), 11 CLK (io), 12 ~{ALERT} (out), 13 PWM4 (out), 14 TACH4 (in), 15 PWM5 (out), 16 TACH5 (in), 17 GND/EPAD (power)

## EMIF06-MSD02N16
designator FL?
FILTER RC(PI) 45 OHM/20PF SMD; Manufacturer: STMicroelectronics; Max Breakdown Voltage: 8V; Number of Channels: 6; Capacitance: 20pF; Pin Number: 16; ESD Protection: Yes; Min Operating Temperature: -30°C; Contact Plating: Gold; Width: 0.047inch; Package Quantity: 1; Length: 3.55mm; Mounting Technology: SMT; Breakdown Voltage: 8V; Max Operating Temperature: 85°C; REACH SVHC: No SVHC; Radiation Hardening: No; Depth: 1.25mm; Height: 0.022inch; Termination: Flat; Packaging: Tape and Reel; Case/Package: QFN; Lead Free: Lead Free; Manufacturer P/N: EMIF06-MSD02N16; ComponentLink1Description: Website; ComponentLink1URL: https://www.st.com/en/protections-and-emi-filters/emif06-msd02n16.html; ComponentLink2Description: Datasheet; ComponentLink2URL: https://www.st.com/resource/en/datasheet/emif06-msd02n16.pdf; Supplier 1: Mouser; Supplier Part Number 1: 511-EMIF06-MSD02N16
footprint uQFP02N16
pins: 1 WP/CD (in), 2 RDATA GND (power), 3 DAT2 In (io), 4 DAT3 In (io), 5 CMD In (io), 6 CLK In (in), 7 DAT0 In (io), 8 DAT1 In (io), 9 DAT1 Ex (io), 10 DAT0 Ex (io), 11 CLK Ex (out), 12 CMD Ex (io), 13 DAT3 Ex (io), 14 DAT2 Ex (io), 15 VCC (power), 16 RDATA VCC (power), 17 GND (power)

## IC-MP174AGJx
designator U?, comment MP174AGJx
700V Non-Isolated Off-Line Regulator, Up to 400mA Output Current; Manufacturer: Monolithic Power Systems; Pin Number: 5; Manufacturer P/N: MP174AGJx; ComponentLink1Description: Datasheet; ComponentLink1URL: https://www.monolithicpower.com/en/documentview/productdocument/index/version/2/document_type/Datasheet/lang/en/sku/MP174A/document_id/4855/; Mounting Technology: SMT; Height (mm): 1; Length (mm): 3; Width (mm): 3
footprint SOT23-5_N (DBV5)
pins: 1 VCC (power), 2 FB, 3 SOURCE, 4 SOURCE, 5 DRAIN (in)

## IC-MP174AGSx
designator U?, comment MP174AGSx
700V Non-Isolated Off-Line Regulator, Up to 400mA Output Current; Manufacturer: Monolithic Power Systems; Manufacturer P/N: MP174AGJx; Pin Number: 5; ComponentLink1Description: Datasheet; ComponentLink1URL: https://www.monolithicpower.com/en/documentview/productdocument/index/version/2/document_type/Datasheet/lang/en/sku/MP174A/document_id/4855/; Mounting Technology: SMT; Height (mm): 1; Length (mm): 3; Width (mm): 3
footprint SOIC-8_N (R_8_ADI)
pins: 1 VCC (power), 2 FB, 3 SOURCE, 4 SOURCE, 5 NC, 6 NC, 7 DRAIN (in), 8 NC

## IC_K30549_VAC
designator U?, comment VAC-K30549  (value not drawn)
300A Open Loop Current Sensor for EV/(P)HEV automotive application.; Manufacturer: Vacuumschmelze; Primary nominal current (A): 300; Primary maximum peak current (A): 450; ComponentLink1Description: Datasheet; ComponentLink1URL: https://drive.google.com/file/d/1PKoGThfhC-0kT0Qr2QoFz8oCPMKyi9ti/view?usp=sharing
footprint VAC_auto_current_sens_1.27_pitch
pins: 1 VCC (power), 2 Vout (out), 3 NC, 4 GND, 5 SHIELD

## ICM-20602
designator U?
Accelerometer, Gyroscope, Temperature, 6 Axis Sensor I2C, SPI Output; Manufacturer: TDK InvenSense; Package: PQFN-16 TDK-InvenSense; SnapEDA_Link: https://www.snapeda.com/parts/ICM-20602/TDK%20InvenSense/view-part/474472/?ref=snap; Manufacturer P/N: ICM-20602; Mounting Technology: SMT; ComponentLink1Description: Manufacturer; ComponentLink1URL: https://invensense.tdk.com/products/motion-tracking/6-axis/icm-20602/; ComponentLink2Description: Datasheet; ComponentLink2URL: https://invensense.tdk.com/download-pdf/icm-20602-datasheet-2/; ComponentLink3Description: SnapEDA; ComponentLink3URL: https://www.snapeda.com/parts/ICM-20602/TDK%20InvenSense/view-part/474472/?ref=snap
footprint PQFN50P300X300X80-16N
pins: 1 VDDIO (power), 2 SCL/SPC (io), 3 SDA/SDI (in), 4 SA0/SDO (out), 5 CS (in), 6 INT (out), 7 RESV DNC, 8 FSYNC (in), 9 RESV NC, 10 RESV NC, 11 RESV NC, 12 RESV NC, 13 GND (power), 14 REGOUT, 15 RESV NC, 16 VDD (power)

## ICM-20689
designator U?
Accelerometer, Gyroscope, Temperature, 6 Axis Sensor IÂ²C, SPI Output; Manufacturer: TDK InvenSense; SnapEDA_Link: https://www.snapeda.com/parts/ICM-20689/TDK%20InvenSense/view-part/537724/?ref=snap; Package: QFN-24 InvenSense; Manufacturer P/N: ICM-20689; Mounting Technology: SMT
footprint QFN50P400X400X95-24N
pins: 8 VDDIO (power), 9 AD0/SDO (io), 10 REGOUT (out), 11 FSYNC (in), 12 INT (out), 13 VDD (power), 18 GND (power), 22 NCS (in), 23 SCL/SCLK (in), 24 SDA/SDI (io)

## IIM-42652
designator U?
Accelerometer X, Y, Z Axis Â±2g, 4g, 8g, 16g 6.25Hz ~ 16kHz 14-LGA (2.5x3); Manufacturer: TDK InvenSense; Manufacturer P/N: IIM-42652; SnapEDA_Link: https://www.snapeda.com/parts/IIM-42652/TDK%20InvenSense/view-part/5873749/?ref=snap; Mounting Technology: SMT; ComponentLink1Description: Manufacturer; ComponentLink1URL: https://product.tdk.com/en/search/sensor/mortion-inertial/imu/info?part_no=IIM-42652; ComponentLink2Description: Datasheet; ComponentLink2URL: https://product.tdk.com/system/files/dam/doc/product/sensor/mortion-inertial/imu/data_sheet/ds-000401-iim-42652.pdf; ComponentLink3Description: SnapEDA; ComponentLink3URL: https://www.snapeda.com/parts/IIM-42652/TDK%20InvenSense/view-part/5873749/?ref=snap
footprint LGA14_TDK
pins: 1 AP_SDO/AP_AD0 (io), 2 RESV, 3 RESV, 4 INT1/INT (out), 5 VDDIO (power), 6 GND (power), 7 RESV_7, 8 VDD (power), 9 INT2/FSYNC/CLKIN (io), 10 RESV, 11 RESV, 12 AP_CS (in), 13 AP_SCL/AP_SCLK (in), 14 AP_SDA/AP_SDIO/AP_SDI (io)

## KSZ8091MLXIA
designator U?
10Base-T/100Base-TX Physical Layer Transceiver with Power Saving Features; Manufacturer: Microchip; Manufacturer P/N: KSZ8091MLXIA; Mounting Technology: SMT; ComponentLink1Description: Datasheet; ComponentLink1URL: https://ww1.microchip.com/downloads/en/DeviceDoc/00002297A.pdf; ComponentLink2Description: Manufacturer; ComponentLink2URL: https://www.microchip.com/wwwproducts/en/KSZ8091
footprint LQFP48_L (PT48A) (QFP, 48-Leads, Body 7x7mm, Pitch 0.5mm, IPC High Density)
footprint LQFP48_M (PT48A) (QFP, 48-Leads, Body 7x7mm, Pitch 0.5mm, IPC Low Density)
footprint LQFP48_N (PT48A) (QFP, 48-Leads, Body 7x7mm, Pitch 0.5mm, IPC Medium Density)
part A pins: 9 RXM (io), 10 RXP (io), 11 TXM (io), 12 TXP (io), 14 XO (out), 15 XI (in), 16 REXT (in), 18 MDIO (io), 19 MDC (in), 20 RXD3/PHYAD0 (io), 21 RXD2/PHYAD1 (io), 22 RXD1/PHYAD2 (io), 23 RXD0/DUPLEX (io), 27 RXDV/CONFIG2 (io), 28 RXC/B-CAST_OFF (io), 29 REXER/ISO (io), 32 INTRP/PME_N2/~{NAND_TREE} (io), 33 TXC/PME_EN (out), 34 TXEN (in), 35 TXD0 (in), 36 TXD1 (in), 38 TXD2 (in), 39 TXD3 (in), 40 COL/CONFIG0 (io), 41 CRS/CONFIG1 (io), 42 LED0/PME_N1/NWAYEN (io), 43 LED1/SPEED (io), 44 TXER (in), 47 ~{RST} (in)
part B pins: 1 GND, 2 GND, 3 GND, 4 VDD_1.2 (power), 5 NC, 6 NC, 7 VDDA_3.3 (power), 8 NC, 13 GND, 17 GND, 24 GND, 25 VDDIO (power), 26 NC, 30 GND, 31 VDD_1.2 (power), 37 GND, 45 NC, 46 NC, 48 NC
